# Altium footprint library Package_QFP.PcbLib: 84 footprints (part 3 of 6)
Each footprint in its own frame and in the unit in brackets; x right, y up, seen from the top. Pads: shape width x height; smd on the part's side, far side on the other; paste and mask are expansions set on the pad; w line width, h text height; cw(c..) or ccw(c..) is an arc to the next point about the centre after c.
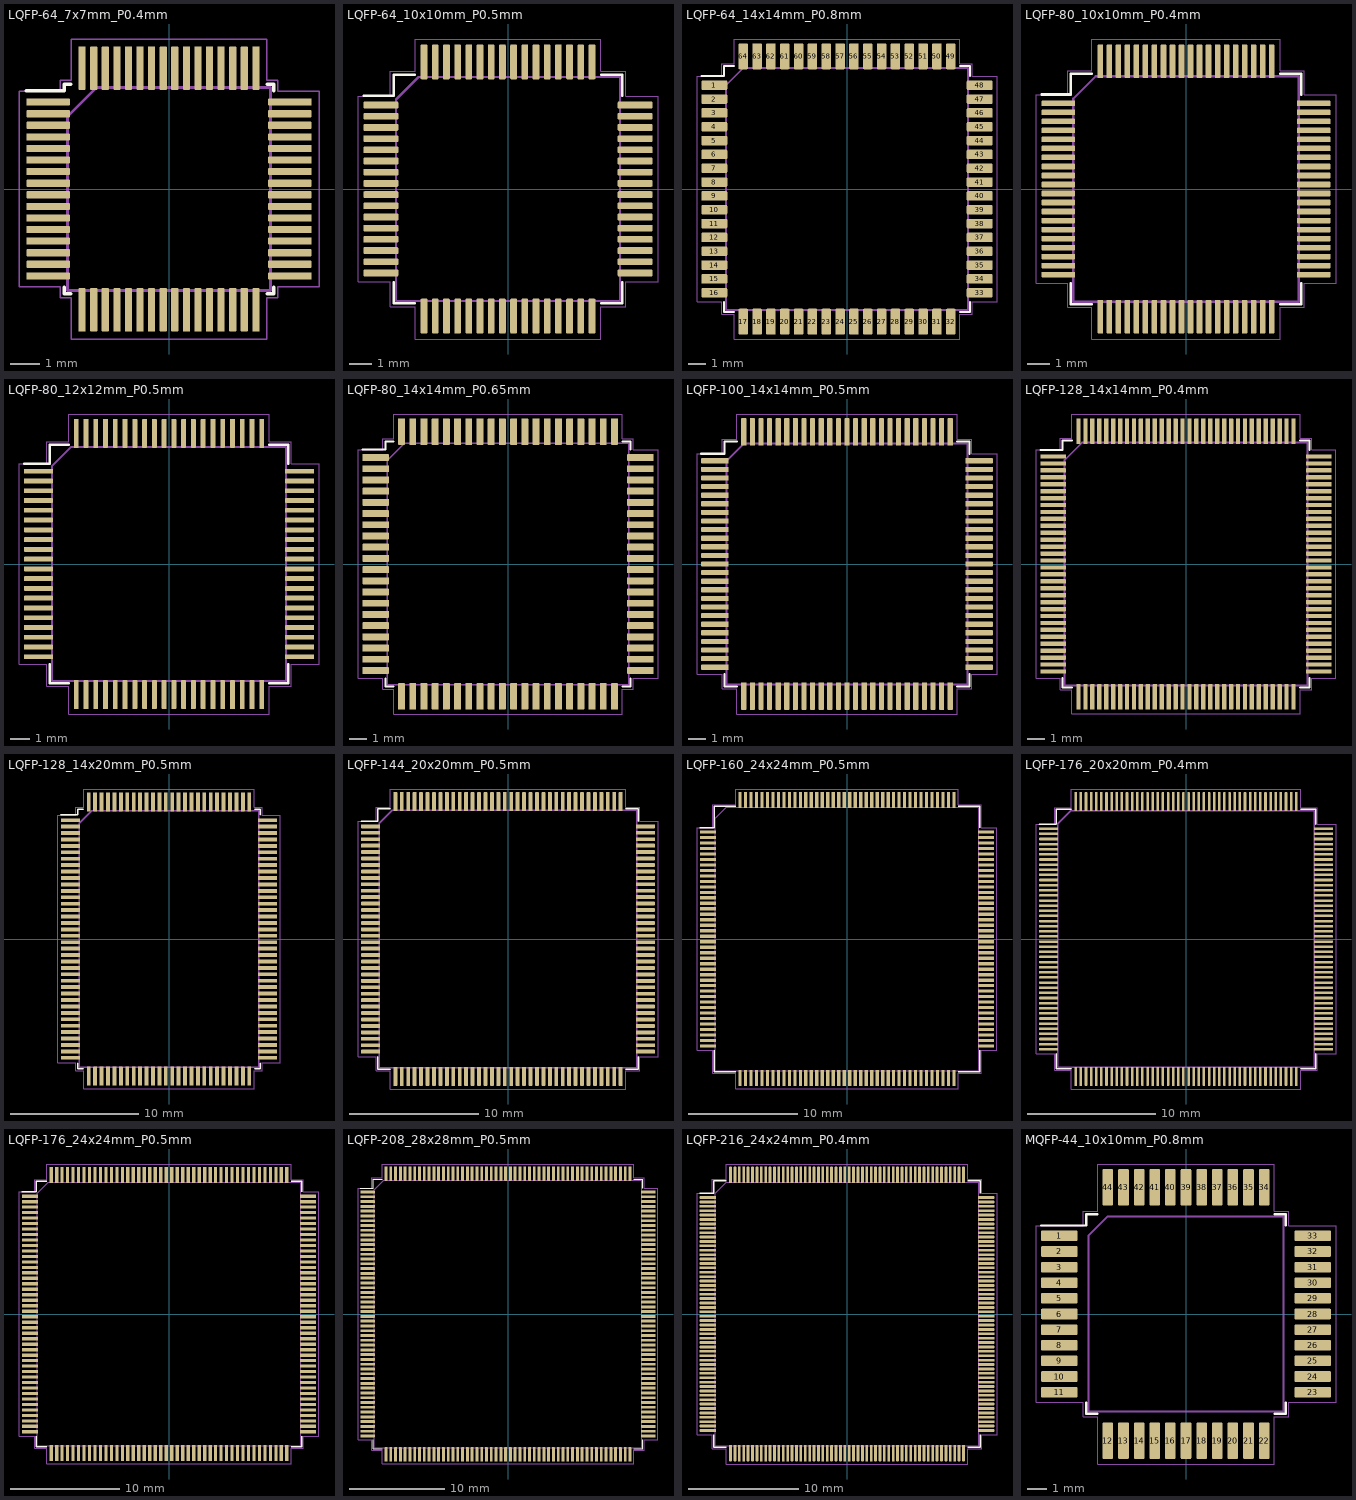
[diagram p2: the footprints below, top view; thin cyan lines are the x and y axes]

## LQFP-64_7x7mm_P0.4mm [mm]
pads (64):
  rrect25% 1.5x0.25 smd: 1(-4.175,3) 2(-4.175,2.6) 3(-4.175,2.2) 4(-4.175,1.8) 5(-4.175,1.4) 6(-4.175,1) 7(-4.175,0.6) 8(-4.175,0.2) 9(-4.175,-0.2) 10(-4.175,-0.6) 11(-4.175,-1) 12(-4.175,-1.4) 13(-4.175,-1.8) 14(-4.175,-2.2) 15(-4.175,-2.6) 16(-4.175,-3) 33(4.175,-3) 34(4.175,-2.6) 35(4.175,-2.2) 36(4.175,-1.8) 37(4.175,-1.4) 38(4.175,-1) 39(4.175,-0.6) 40(4.175,-0.2) 41(4.175,0.2) 42(4.175,0.6) 43(4.175,1) 44(4.175,1.4) 45(4.175,1.8) 46(4.175,2.2) 47(4.175,2.6) 48(4.175,3)
  rrect25% 0.25x1.5 smd: 17(-3,-4.175) 18(-2.6,-4.175) 19(-2.2,-4.175) 20(-1.8,-4.175) 21(-1.4,-4.175) 22(-1,-4.175) 23(-0.6,-4.175) 24(-0.2,-4.175) 25(0.2,-4.175) 26(0.6,-4.175) 27(1,-4.175) 28(1.4,-4.175) 29(1.8,-4.175) 30(2.2,-4.175) 31(2.6,-4.175) 32(3,-4.175) 49(3,4.175) 50(2.6,4.175) 51(2.2,4.175) 52(1.8,4.175) 53(1.4,4.175) 54(1,4.175) 55(0.6,4.175) 56(0.2,4.175) 57(-0.2,4.175) 58(-0.6,4.175) 59(-1,4.175) 60(-1.4,4.175) 61(-1.8,4.175) 62(-2.2,4.175) 63(-2.6,4.175) 64(-3,4.175)
F.SilkS:
  lines w0.12: -4.925,3.385 -3.61,3.385 -3.61,3.61 -3.385,3.61 ; -3.61,-3.385 -3.61,-3.61 -3.385,-3.61 ; 3.385,-3.61 3.61,-3.61 3.61,-3.385 ; 3.385,3.61 3.61,3.61 3.61,3.385
F.CrtYd:
  lines w0.05: -5.18,-3.38 -5.18,0 -5.18,3.38 -3.75,3.38 -3.75,3.75 -3.38,3.75 -3.38,5.18 0,5.18 3.38,5.18 3.38,3.75 3.75,3.75 3.75,3.38 5.18,3.38 5.18,0 5.18,-3.38 3.75,-3.38 3.75,-3.75 3.38,-3.75 3.38,-5.18 0,-5.18 -3.38,-5.18 -3.38,-3.75 -3.75,-3.75 -3.75,-3.38 -5.18,-3.38
F.Fab:
  lines w0.1: -3.5,-3.5 -3.5,2.5 -2.5,3.5 3.5,3.5 3.5,-3.5 -3.5,-3.5
  text "'.Designator'" at -3.897,-0.357 h1
3D body "LQFP-64_7x7mm_P0.4mm.step": height 1.5, standoff 0, extent -4.9,-4.9 4.9,4.9

## LQFP-64_10x10mm_P0.5mm [mm]
pads (64):
  rrect25% 1.55x0.3 smd: 1(-5.675,3.75) 2(-5.675,3.25) 3(-5.675,2.75) 4(-5.675,2.25) 5(-5.675,1.75) 6(-5.675,1.25) 7(-5.675,0.75) 8(-5.675,0.25) 9(-5.675,-0.25) 10(-5.675,-0.75) 11(-5.675,-1.25) 12(-5.675,-1.75) 13(-5.675,-2.25) 14(-5.675,-2.75) 15(-5.675,-3.25) 16(-5.675,-3.75) 33(5.675,-3.75) 34(5.675,-3.25) 35(5.675,-2.75) 36(5.675,-2.25) 37(5.675,-1.75) 38(5.675,-1.25) 39(5.675,-0.75) 40(5.675,-0.25) 41(5.675,0.25) 42(5.675,0.75) 43(5.675,1.25) 44(5.675,1.75) 45(5.675,2.25) 46(5.675,2.75) 47(5.675,3.25) 48(5.675,3.75)
  rrect25% 0.3x1.55 smd: 17(-3.75,-5.675) 18(-3.25,-5.675) 19(-2.75,-5.675) 20(-2.25,-5.675) 21(-1.75,-5.675) 22(-1.25,-5.675) 23(-0.75,-5.675) 24(-0.25,-5.675) 25(0.25,-5.675) 26(0.75,-5.675) 27(1.25,-5.675) 28(1.75,-5.675) 29(2.25,-5.675) 30(2.75,-5.675) 31(3.25,-5.675) 32(3.75,-5.675) 49(3.75,5.675) 50(3.25,5.675) 51(2.75,5.675) 52(2.25,5.675) 53(1.75,5.675) 54(1.25,5.675) 55(0.75,5.675) 56(0.25,5.675) 57(-0.25,5.675) 58(-0.75,5.675) 59(-1.25,5.675) 60(-1.75,5.675) 61(-2.25,5.675) 62(-2.75,5.675) 63(-3.25,5.675) 64(-3.75,5.675)
F.SilkS:
  lines w0.12: -6.45,4.16 -5.11,4.16 -5.11,5.11 -4.16,5.11 ; -5.11,-4.16 -5.11,-5.11 -4.16,-5.11 ; 4.16,-5.11 5.11,-5.11 5.11,-4.16 ; 4.16,5.11 5.11,5.11 5.11,4.16
F.CrtYd:
  lines w0.05: -6.7,-4.15 -5.25,-4.15 -5.25,-5.25 -4.15,-5.25 -4.15,-6.7 0,-6.7 4.15,-6.7 4.15,-5.25 5.25,-5.25 5.25,-4.15 6.7,-4.15 6.7,0 6.7,4.15 5.25,4.15 5.25,5.25 4.15,5.25 4.15,6.7 0,6.7 -4.15,6.7 -4.15,5.25 -5.25,5.25 -5.25,4.15 -6.7,4.15 -6.7,0 -6.7,-4.15
F.Fab:
  lines w0.1: -5,-5 -5,4 -4,5 5,5 5,-5 -5,-5
  text "'.Designator'" at -4.047,-0.84 h1
3D body "LQFP-64_10x10mm_P0.5mm.step": height 1.5, standoff 0, extent -6,-6 6,6

## LQFP-64_14x14mm_P0.8mm [mm]
pads (64):
  rrect25% 1.5x0.55 smd: 1(-7.675,6) 2(-7.675,5.2) 3(-7.675,4.4) 4(-7.675,3.6) 5(-7.675,2.8) 6(-7.675,2) 7(-7.675,1.2) 8(-7.675,0.4) 9(-7.675,-0.4) 10(-7.675,-1.2) 11(-7.675,-2) 12(-7.675,-2.8) 13(-7.675,-3.6) 14(-7.675,-4.4) 15(-7.675,-5.2) 16(-7.675,-6) 33(7.675,-6) 34(7.675,-5.2) 35(7.675,-4.4) 36(7.675,-3.6) 37(7.675,-2.8) 38(7.675,-2) 39(7.675,-1.2) 40(7.675,-0.4) 41(7.675,0.4) 42(7.675,1.2) 43(7.675,2) 44(7.675,2.8) 45(7.675,3.6) 46(7.675,4.4) 47(7.675,5.2) 48(7.675,6)
  rrect25% 0.55x1.5 smd: 17(-6,-7.675) 18(-5.2,-7.675) 19(-4.4,-7.675) 20(-3.6,-7.675) 21(-2.8,-7.675) 22(-2,-7.675) 23(-1.2,-7.675) 24(-0.4,-7.675) 25(0.4,-7.675) 26(1.2,-7.675) 27(2,-7.675) 28(2.8,-7.675) 29(3.6,-7.675) 30(4.4,-7.675) 31(5.2,-7.675) 32(6,-7.675) 49(6,7.675) 50(5.2,7.675) 51(4.4,7.675) 52(3.6,7.675) 53(2.8,7.675) 54(2,7.675) 55(1.2,7.675) 56(0.4,7.675) 57(-0.4,7.675) 58(-1.2,7.675) 59(-2,7.675) 60(-2.8,7.675) 61(-3.6,7.675) 62(-4.4,7.675) 63(-5.2,7.675) 64(-6,7.675)
F.SilkS:
  lines w0.12: -8.425,6.535 -7.11,6.535 -7.11,7.11 -6.535,7.11 ; -7.11,-6.535 -7.11,-7.11 -6.535,-7.11 ; 6.535,-7.11 7.11,-7.11 7.11,-6.535 ; 6.535,7.11 7.11,7.11 7.11,6.535
F.CrtYd:
  lines w0.05: -8.68,-6.52 -8.68,0 -8.68,6.52 -7.25,6.52 -7.25,7.25 -6.52,7.25 -6.52,8.68 0,8.68 6.52,8.68 6.52,7.25 7.25,7.25 7.25,6.52 8.68,6.52 8.68,0 8.68,-6.52 7.25,-6.52 7.25,-7.25 6.52,-7.25 6.52,-8.68 0,-8.68 -6.52,-8.68 -6.52,-7.25 -7.25,-7.25 -7.25,-6.52 -8.68,-6.52
F.Fab:
  lines w0.1: -7,-7 7,-7 7,7 -6,7 -7,6 -7,-7
  text "'.Designator'" at -4.047,-0.84 h1
3D body "LQFP-64_14x14mm_P0.8mm.step": height 1.5, standoff 0, extent -8,-8 8,8

## LQFP-80_10x10mm_P0.4mm [mm]
pads (80):
  rrect25% 1.475x0.25 smd: 1(-5.663,3.8) 2(-5.663,3.4) 3(-5.663,3) 4(-5.663,2.6) 5(-5.663,2.2) 6(-5.663,1.8) 7(-5.663,1.4) 8(-5.663,1) 9(-5.663,0.6) 10(-5.663,0.2) 11(-5.663,-0.2) 12(-5.663,-0.6) 13(-5.663,-1) 14(-5.663,-1.4) 15(-5.663,-1.8) 16(-5.663,-2.2) 17(-5.663,-2.6) 18(-5.663,-3) 19(-5.663,-3.4) 20(-5.663,-3.8) 41(5.663,-3.8) 42(5.663,-3.4) 43(5.663,-3) 44(5.663,-2.6) 45(5.663,-2.2) 46(5.663,-1.8) 47(5.663,-1.4) 48(5.663,-1) 49(5.663,-0.6) 50(5.663,-0.2) 51(5.663,0.2) 52(5.663,0.6) 53(5.663,1) 54(5.663,1.4) 55(5.663,1.8) 56(5.663,2.2) 57(5.663,2.6) 58(5.663,3) 59(5.663,3.4) 60(5.663,3.8)
  rrect25% 0.25x1.475 smd: 21(-3.8,-5.663) 22(-3.4,-5.663) 23(-3,-5.663) 24(-2.6,-5.663) 25(-2.2,-5.663) 26(-1.8,-5.663) 27(-1.4,-5.663) 28(-1,-5.663) 29(-0.6,-5.663) 30(-0.2,-5.663) 31(0.2,-5.663) 32(0.6,-5.663) 33(1,-5.663) 34(1.4,-5.663) 35(1.8,-5.663) 36(2.2,-5.663) 37(2.6,-5.663) 38(3,-5.663) 39(3.4,-5.663) 40(3.8,-5.663) 61(3.8,5.663) 62(3.4,5.663) 63(3,5.663) 64(2.6,5.663) 65(2.2,5.663) 66(1.8,5.663) 67(1.4,5.663) 68(1,5.663) 69(0.6,5.663) 70(0.2,5.663) 71(-0.2,5.663) 72(-0.6,5.663) 73(-1,5.663) 74(-1.4,5.663) 75(-1.8,5.663) 76(-2.2,5.663) 77(-2.6,5.663) 78(-3,5.663) 79(-3.4,5.663) 80(-3.8,5.663)
F.SilkS:
  lines w0.12: -6.4,4.185 -5.11,4.185 -5.11,5.11 -4.185,5.11 ; -5.11,-4.185 -5.11,-5.11 -4.185,-5.11 ; 4.185,-5.11 5.11,-5.11 5.11,-4.185 ; 4.185,5.11 5.11,5.11 5.11,4.185
F.CrtYd:
  lines w0.05: -6.65,-4.18 -6.65,0 -6.65,4.18 -5.25,4.18 -5.25,5.25 -4.18,5.25 -4.18,6.65 0,6.65 4.18,6.65 4.18,5.25 5.25,5.25 5.25,4.18 6.65,4.18 6.65,0 6.65,-4.18 5.25,-4.18 5.25,-5.25 4.18,-5.25 4.18,-6.65 0,-6.65 -4.18,-6.65 -4.18,-5.25 -5.25,-5.25 -5.25,-4.18 -6.65,-4.18
F.Fab:
  lines w0.1: -5,-5 -5,4 -4,5 5,5 5,-5 -5,-5
  text "'.Designator'" at -4.047,-0.84 h1
3D body "LQFP-80_10x10mm_P0.4mm.step": height 1.6, standoff 0, extent -6.15,-6.15 6.15,6.15

## LQFP-80_12x12mm_P0.5mm [mm]
pads (80):
  rrect25% 1.475x0.25 smd: 1(-6.687,4.75) 2(-6.687,4.25) 3(-6.687,3.75) 4(-6.687,3.25) 5(-6.687,2.75) 6(-6.687,2.25) 7(-6.687,1.75) 8(-6.687,1.25) 9(-6.687,0.75) 10(-6.687,0.25) 11(-6.687,-0.25) 12(-6.687,-0.75) 13(-6.687,-1.25) 14(-6.687,-1.75) 15(-6.687,-2.25) 16(-6.687,-2.75) 17(-6.687,-3.25) 18(-6.687,-3.75) 19(-6.687,-4.25) 20(-6.687,-4.75) 41(6.687,-4.75) 42(6.687,-4.25) 43(6.687,-3.75) 44(6.687,-3.25) 45(6.687,-2.75) 46(6.687,-2.25) 47(6.687,-1.75) 48(6.687,-1.25) 49(6.687,-0.75) 50(6.687,-0.25) 51(6.687,0.25) 52(6.687,0.75) 53(6.687,1.25) 54(6.687,1.75) 55(6.687,2.25) 56(6.687,2.75) 57(6.687,3.25) 58(6.687,3.75) 59(6.687,4.25) 60(6.687,4.75)
  rrect25% 0.25x1.475 smd: 21(-4.75,-6.687) 22(-4.25,-6.687) 23(-3.75,-6.687) 24(-3.25,-6.687) 25(-2.75,-6.687) 26(-2.25,-6.687) 27(-1.75,-6.687) 28(-1.25,-6.687) 29(-0.75,-6.687) 30(-0.25,-6.687) 31(0.25,-6.687) 32(0.75,-6.687) 33(1.25,-6.687) 34(1.75,-6.687) 35(2.25,-6.687) 36(2.75,-6.687) 37(3.25,-6.687) 38(3.75,-6.687) 39(4.25,-6.687) 40(4.75,-6.687) 61(4.75,6.687) 62(4.25,6.687) 63(3.75,6.687) 64(3.25,6.687) 65(2.75,6.687) 66(2.25,6.687) 67(1.75,6.687) 68(1.25,6.687) 69(0.75,6.687) 70(0.25,6.687) 71(-0.25,6.687) 72(-0.75,6.687) 73(-1.25,6.687) 74(-1.75,6.687) 75(-2.25,6.687) 76(-2.75,6.687) 77(-3.25,6.687) 78(-3.75,6.687) 79(-4.25,6.687) 80(-4.75,6.687)
F.SilkS:
  lines w0.12: -7.425,5.135 -6.11,5.135 -6.11,6.11 -5.135,6.11 ; -6.11,-5.135 -6.11,-6.11 -5.135,-6.11 ; 5.135,-6.11 6.11,-6.11 6.11,-5.135 ; 5.135,6.11 6.11,6.11 6.11,5.135
F.CrtYd:
  lines w0.05: -7.68,-5.12 -6.25,-5.12 -6.25,-6.25 -5.12,-6.25 -5.12,-7.68 0,-7.68 5.12,-7.68 5.12,-6.25 6.25,-6.25 6.25,-5.12 7.68,-5.12 7.68,0 7.68,5.12 6.25,5.12 6.25,6.25 5.12,6.25 5.12,7.68 0,7.68 -5.12,7.68 -5.12,6.25 -6.25,6.25 -6.25,5.12 -7.68,5.12 -7.68,0 -7.68,-5.12
F.Fab:
  lines w0.1: -6,-6 6,-6 6,6 -5,6 -6,5 -6,-6
  text "'.Designator'" at -4.047,-0.84 h1
3D body "LQFP-80_12x12mm_P0.5mm.step": height 1.5, standoff 0, extent -7,-7 7,7

## LQFP-80_14x14mm_P0.65mm [mm]
pads (80):
  rrect25% 1.55x0.4 smd: 1(-7.675,6.175) 2(-7.675,5.525) 3(-7.675,4.875) 4(-7.675,4.225) 5(-7.675,3.575) 6(-7.675,2.925) 7(-7.675,2.275) 8(-7.675,1.625) 9(-7.675,0.975) 10(-7.675,0.325) 11(-7.675,-0.325) 12(-7.675,-0.975) 13(-7.675,-1.625) 14(-7.675,-2.275) 15(-7.675,-2.925) 16(-7.675,-3.575) 17(-7.675,-4.225) 18(-7.675,-4.875) 19(-7.675,-5.525) 20(-7.675,-6.175) 41(7.675,-6.175) 42(7.675,-5.525) 43(7.675,-4.875) 44(7.675,-4.225) 45(7.675,-3.575) 46(7.675,-2.925) 47(7.675,-2.275) 48(7.675,-1.625) 49(7.675,-0.975) 50(7.675,-0.325) 51(7.675,0.325) 52(7.675,0.975) 53(7.675,1.625) 54(7.675,2.275) 55(7.675,2.925) 56(7.675,3.575) 57(7.675,4.225) 58(7.675,4.875) 59(7.675,5.525) 60(7.675,6.175)
  rrect25% 0.4x1.55 smd: 21(-6.175,-7.675) 22(-5.525,-7.675) 23(-4.875,-7.675) 24(-4.225,-7.675) 25(-3.575,-7.675) 26(-2.925,-7.675) 27(-2.275,-7.675) 28(-1.625,-7.675) 29(-0.975,-7.675) 30(-0.325,-7.675) 31(0.325,-7.675) 32(0.975,-7.675) 33(1.625,-7.675) 34(2.275,-7.675) 35(2.925,-7.675) 36(3.575,-7.675) 37(4.225,-7.675) 38(4.875,-7.675) 39(5.525,-7.675) 40(6.175,-7.675) 61(6.175,7.675) 62(5.525,7.675) 63(4.875,7.675) 64(4.225,7.675) 65(3.575,7.675) 66(2.925,7.675) 67(2.275,7.675) 68(1.625,7.675) 69(0.975,7.675) 70(0.325,7.675) 71(-0.325,7.675) 72(-0.975,7.675) 73(-1.625,7.675) 74(-2.275,7.675) 75(-2.925,7.675) 76(-3.575,7.675) 77(-4.225,7.675) 78(-4.875,7.675) 79(-5.525,7.675) 80(-6.175,7.675)
F.SilkS:
  lines w0.12: -8.45,6.635 -7.11,6.635 -7.11,7.11 -6.635,7.11 ; -7.11,-6.635 -7.11,-7.11 -6.635,-7.11 ; 6.635,-7.11 7.11,-7.11 7.11,-6.635 ; 6.635,7.11 7.11,7.11 7.11,6.635
F.CrtYd:
  lines w0.05: -8.7,-6.62 -7.25,-6.62 -7.25,-7.25 -6.62,-7.25 -6.62,-8.7 0,-8.7 6.62,-8.7 6.62,-7.25 7.25,-7.25 7.25,-6.62 8.7,-6.62 8.7,0 8.7,6.62 7.25,6.62 7.25,7.25 6.62,7.25 6.62,8.7 0,8.7 -6.62,8.7 -6.62,7.25 -7.25,7.25 -7.25,6.62 -8.7,6.62 -8.7,0 -8.7,-6.62
F.Fab:
  lines w0.1: -7,-7 7,-7 7,7 -6,7 -7,6 -7,-7
  text "'.Designator'" at -4.047,-0.84 h1
3D body "LQFP-80_14x14mm_P0.65mm.step": height 1.6, standoff 0, extent -8.2,-8.2 8.2,8.2

## LQFP-100_14x14mm_P0.5mm [mm]
pads (100):
  rrect25% 1.6x0.3 smd mask+0.051: 1(-7.675,6) 2(-7.675,5.5) 3(-7.675,5) 4(-7.675,4.5) 5(-7.675,4) 6(-7.675,3.5) 7(-7.675,3) 8(-7.675,2.5) 9(-7.675,2) 10(-7.675,1.5) 11(-7.675,1) 12(-7.675,0.5) 13(-7.675,0) 14(-7.675,-0.5) 15(-7.675,-1) 16(-7.675,-1.5) 17(-7.675,-2) 18(-7.675,-2.5) 19(-7.675,-3) 20(-7.675,-3.5) 21(-7.675,-4) 22(-7.675,-4.5) 23(-7.675,-5) 24(-7.675,-5.5) 25(-7.675,-6) 51(7.675,-6) 52(7.675,-5.5) 53(7.675,-5) 54(7.675,-4.5) 55(7.675,-4) 56(7.675,-3.5) 57(7.675,-3) 58(7.675,-2.5) 59(7.675,-2) 60(7.675,-1.5) 61(7.675,-1) 62(7.675,-0.5) 63(7.675,0) 64(7.675,0.5) 65(7.675,1) 66(7.675,1.5) 67(7.675,2) 68(7.675,2.5) 69(7.675,3) 70(7.675,3.5) 71(7.675,4) 72(7.675,4.5) 73(7.675,5) 74(7.675,5.5) 75(7.675,6)
  rrect25% 0.3x1.6 smd mask+0.051: 26(-6,-7.675) 27(-5.5,-7.675) 28(-5,-7.675) 29(-4.5,-7.675) 30(-4,-7.675) 31(-3.5,-7.675) 32(-3,-7.675) 33(-2.5,-7.675) 34(-2,-7.675) 35(-1.5,-7.675) 36(-1,-7.675) 37(-0.5,-7.675) 38(0,-7.675) 39(0.5,-7.675) 40(1,-7.675) 41(1.5,-7.675) 42(2,-7.675) 43(2.5,-7.675) 44(3,-7.675) 45(3.5,-7.675) 46(4,-7.675) 47(4.5,-7.675) 48(5,-7.675) 49(5.5,-7.675) 50(6,-7.675) 76(6,7.675) 77(5.5,7.675) 78(5,7.675) 79(4.5,7.675) 80(4,7.675) 81(3.5,7.675) 82(3,7.675) 83(2.5,7.675) 84(2,7.675) 85(1.5,7.675) 86(1,7.675) 87(0.5,7.675) 88(0,7.675) 89(-0.5,7.675) 90(-1,7.675) 91(-1.5,7.675) 92(-2,7.675) 93(-2.5,7.675) 94(-3,7.675) 95(-3.5,7.675) 96(-4,7.675) 97(-4.5,7.675) 98(-5,7.675) 99(-5.5,7.675) 100(-6,7.675)
F.SilkS:
  lines w0.12: -8.475,6.41 -7.11,6.41 -7.11,7.11 -6.41,7.11 ; -7.11,-6.41 -7.11,-7.11 -6.41,-7.11 ; 6.41,-7.11 7.11,-7.11 7.11,-6.41 ; 6.41,7.11 7.11,7.11 7.11,6.41
F.CrtYd:
  lines w0.05: -8.72,-6.4 -8.72,0 -8.72,6.4 -7.25,6.4 -7.25,7.25 -6.4,7.25 -6.4,8.72 0,8.72 6.4,8.72 6.4,7.25 7.25,7.25 7.25,6.4 8.72,6.4 8.72,0 8.72,-6.4 7.25,-6.4 7.25,-7.25 6.4,-7.25 6.4,-8.72 0,-8.72 -6.4,-8.72 -6.4,-7.25 -7.25,-7.25 -7.25,-6.4 -8.72,-6.4
F.Fab:
  lines w0.1: -7,-7 7,-7 7,7 -6,7 -7,6 -7,-7
  text "'.Designator'" at -3.897,-0.357 h1
3D body "LQFP-100_14x14mm_P0.5mm.step": height 1.5, standoff 0, extent -8,-8 8,8

## LQFP-128_14x14mm_P0.4mm [mm]
pads (128):
  rrect25% 1.475x0.25 smd: 1(-7.662,6.2) 2(-7.662,5.8) 3(-7.662,5.4) 4(-7.662,5) 5(-7.662,4.6) 6(-7.662,4.2) 7(-7.662,3.8) 8(-7.662,3.4) 9(-7.662,3) 10(-7.662,2.6) 11(-7.662,2.2) 12(-7.662,1.8) 13(-7.662,1.4) 14(-7.662,1) 15(-7.662,0.6) 16(-7.662,0.2) 17(-7.662,-0.2) 18(-7.662,-0.6) 19(-7.662,-1) 20(-7.662,-1.4) 21(-7.662,-1.8) 22(-7.662,-2.2) 23(-7.662,-2.6) 24(-7.662,-3) 25(-7.662,-3.4) 26(-7.662,-3.8) 27(-7.662,-4.2) 28(-7.662,-4.6) 29(-7.662,-5) 30(-7.662,-5.4) 31(-7.662,-5.8) 32(-7.662,-6.2) 65(7.662,-6.2) 66(7.662,-5.8) 67(7.662,-5.4) 68(7.662,-5) 69(7.662,-4.6) 70(7.662,-4.2) 71(7.662,-3.8) 72(7.662,-3.4) 73(7.662,-3) 74(7.662,-2.6) 75(7.662,-2.2) 76(7.662,-1.8) 77(7.662,-1.4) 78(7.662,-1) 79(7.662,-0.6) 80(7.662,-0.2) 81(7.662,0.2) 82(7.662,0.6) 83(7.662,1) 84(7.662,1.4) 85(7.662,1.8) 86(7.662,2.2) 87(7.662,2.6) 88(7.662,3) 89(7.662,3.4) 90(7.662,3.8) 91(7.662,4.2) 92(7.662,4.6) 93(7.662,5) 94(7.662,5.4) 95(7.662,5.8) 96(7.662,6.2)
  rrect25% 0.25x1.475 smd: 33(-6.2,-7.662) 34(-5.8,-7.662) 35(-5.4,-7.662) 36(-5,-7.662) 37(-4.6,-7.662) 38(-4.2,-7.662) 39(-3.8,-7.662) 40(-3.4,-7.662) 41(-3,-7.662) 42(-2.6,-7.662) 43(-2.2,-7.662) 44(-1.8,-7.662) 45(-1.4,-7.662) 46(-1,-7.662) 47(-0.6,-7.662) 48(-0.2,-7.662) 49(0.2,-7.662) 50(0.6,-7.662) 51(1,-7.662) 52(1.4,-7.662) 53(1.8,-7.662) 54(2.2,-7.662) 55(2.6,-7.662) 56(3,-7.662) 57(3.4,-7.662) 58(3.8,-7.662) 59(4.2,-7.662) 60(4.6,-7.662) 61(5,-7.662) 62(5.4,-7.662) 63(5.8,-7.662) 64(6.2,-7.662) 97(6.2,7.662) 98(5.8,7.662) 99(5.4,7.662) 100(5,7.662) 101(4.6,7.662) 102(4.2,7.662) 103(3.8,7.662) 104(3.4,7.662) 105(3,7.662) 106(2.6,7.662) 107(2.2,7.662) 108(1.8,7.662) 109(1.4,7.662) 110(1,7.662) 111(0.6,7.662) 112(0.2,7.662) 113(-0.2,7.662) 114(-0.6,7.662) 115(-1,7.662) 116(-1.4,7.662) 117(-1.8,7.662) 118(-2.2,7.662) 119(-2.6,7.662) 120(-3,7.662) 121(-3.4,7.662) 122(-3.8,7.662) 123(-4.2,7.662) 124(-4.6,7.662) 125(-5,7.662) 126(-5.4,7.662) 127(-5.8,7.662) 128(-6.2,7.662)
F.SilkS:
  lines w0.12: -8.4,6.585 -7.11,6.585 -7.11,7.11 -6.585,7.11 ; -7.11,-6.585 -7.11,-7.11 -6.585,-7.11 ; 6.585,-7.11 7.11,-7.11 7.11,-6.585 ; 6.585,7.11 7.11,7.11 7.11,6.585
F.CrtYd:
  lines w0.05: -8.65,-6.58 -7.25,-6.58 -7.25,-7.25 -6.58,-7.25 -6.58,-8.65 0,-8.65 6.58,-8.65 6.58,-7.25 7.25,-7.25 7.25,-6.58 8.65,-6.58 8.65,0 8.65,6.58 7.25,6.58 7.25,7.25 6.58,7.25 6.58,8.65 0,8.65 -6.58,8.65 -6.58,7.25 -7.25,7.25 -7.25,6.58 -8.65,6.58 -8.65,0 -8.65,-6.58
F.Fab:
  lines w0.1: -7,-7 -7,6 -6,7 7,7 7,-7 -7,-7
  text "'.Designator'" at -4.047,-0.84 h1
3D body "LQFP-128_14x14mm_P0.4mm.step": height 1.5, standoff 0, extent -8,-8 8,8

## LQFP-128_14x20mm_P0.5mm [mm]
pads (128):
  rrect25% 1.5x0.3 smd: 1(-7.675,9.25) 2(-7.675,8.75) 3(-7.675,8.25) 4(-7.675,7.75) 5(-7.675,7.25) 6(-7.675,6.75) 7(-7.675,6.25) 8(-7.675,5.75) 9(-7.675,5.25) 10(-7.675,4.75) 11(-7.675,4.25) 12(-7.675,3.75) 13(-7.675,3.25) 14(-7.675,2.75) 15(-7.675,2.25) 16(-7.675,1.75) 17(-7.675,1.25) 18(-7.675,0.75) 19(-7.675,0.25) 20(-7.675,-0.25) 21(-7.675,-0.75) 22(-7.675,-1.25) 23(-7.675,-1.75) 24(-7.675,-2.25) 25(-7.675,-2.75) 26(-7.675,-3.25) 27(-7.675,-3.75) 28(-7.675,-4.25) 29(-7.675,-4.75) 30(-7.675,-5.25) 31(-7.675,-5.75) 32(-7.675,-6.25) 33(-7.675,-6.75) 34(-7.675,-7.25) 35(-7.675,-7.75) 36(-7.675,-8.25) 37(-7.675,-8.75) 38(-7.675,-9.25) 65(7.675,-9.25) 66(7.675,-8.75) 67(7.675,-8.25) 68(7.675,-7.75) 69(7.675,-7.25) 70(7.675,-6.75) 71(7.675,-6.25) 72(7.675,-5.75) 73(7.675,-5.25) 74(7.675,-4.75) 75(7.675,-4.25) 76(7.675,-3.75) 77(7.675,-3.25) 78(7.675,-2.75) 79(7.675,-2.25) 80(7.675,-1.75) 81(7.675,-1.25) 82(7.675,-0.75) 83(7.675,-0.25) 84(7.675,0.25) 85(7.675,0.75) 86(7.675,1.25) 87(7.675,1.75) 88(7.675,2.25) 89(7.675,2.75) 90(7.675,3.25) 91(7.675,3.75) 92(7.675,4.25) 93(7.675,4.75) 94(7.675,5.25) 95(7.675,5.75) 96(7.675,6.25) 97(7.675,6.75) 98(7.675,7.25) 99(7.675,7.75) 100(7.675,8.25) 101(7.675,8.75) 102(7.675,9.25)
  rrect25% 0.3x1.5 smd: 39(-6.25,-10.675) 40(-5.75,-10.675) 41(-5.25,-10.675) 42(-4.75,-10.675) 43(-4.25,-10.675) 44(-3.75,-10.675) 45(-3.25,-10.675) 46(-2.75,-10.675) 47(-2.25,-10.675) 48(-1.75,-10.675) 49(-1.25,-10.675) 50(-0.75,-10.675) 51(-0.25,-10.675) 52(0.25,-10.675) 53(0.75,-10.675) 54(1.25,-10.675) 55(1.75,-10.675) 56(2.25,-10.675) 57(2.75,-10.675) 58(3.25,-10.675) 59(3.75,-10.675) 60(4.25,-10.675) 61(4.75,-10.675) 62(5.25,-10.675) 63(5.75,-10.675) 64(6.25,-10.675) 103(6.25,10.675) 104(5.75,10.675) 105(5.25,10.675) 106(4.75,10.675) 107(4.25,10.675) 108(3.75,10.675) 109(3.25,10.675) 110(2.75,10.675) 111(2.25,10.675) 112(1.75,10.675) 113(1.25,10.675) 114(0.75,10.675) 115(0.25,10.675) 116(-0.25,10.675) 117(-0.75,10.675) 118(-1.25,10.675) 119(-1.75,10.675) 120(-2.25,10.675) 121(-2.75,10.675) 122(-3.25,10.675) 123(-3.75,10.675) 124(-4.25,10.675) 125(-4.75,10.675) 126(-5.25,10.675) 127(-5.75,10.675) 128(-6.25,10.675)
F.SilkS:
  lines w0.12: -8.425,9.66 -7.11,9.66 -7.11,10.11 -6.66,10.11 ; -7.11,-9.66 -7.11,-10.11 -6.66,-10.11 ; 6.66,-10.11 7.11,-10.11 7.11,-9.66 ; 6.66,10.11 7.11,10.11 7.11,9.66
F.CrtYd:
  lines w0.05: -8.68,-9.65 -8.68,0 -8.68,9.65 -7.25,9.65 -7.25,10.25 -6.65,10.25 -6.65,11.68 0,11.68 6.65,11.68 6.65,10.25 7.25,10.25 7.25,9.65 8.68,9.65 8.68,0 8.68,-9.65 7.25,-9.65 7.25,-10.25 6.65,-10.25 6.65,-11.68 0,-11.68 -6.65,-11.68 -6.65,-10.25 -7.25,-10.25 -7.25,-9.65 -8.68,-9.65
F.Fab:
  lines w0.1: -7,-10 7,-10 7,10 -6,10 -7,9 -7,-10
  text "'.Designator'" at -4.047,-0.84 h1
3D body "LQFP-128_14x20mm_P0.5mm.step": height 1.5, standoff 0, extent -8,-11 8,11
